# Altium integrated library RL2.IntLib: 663 symbols (part 1 of 4)
Pins are listed as number, name and electrical type; pins without a type are passive.

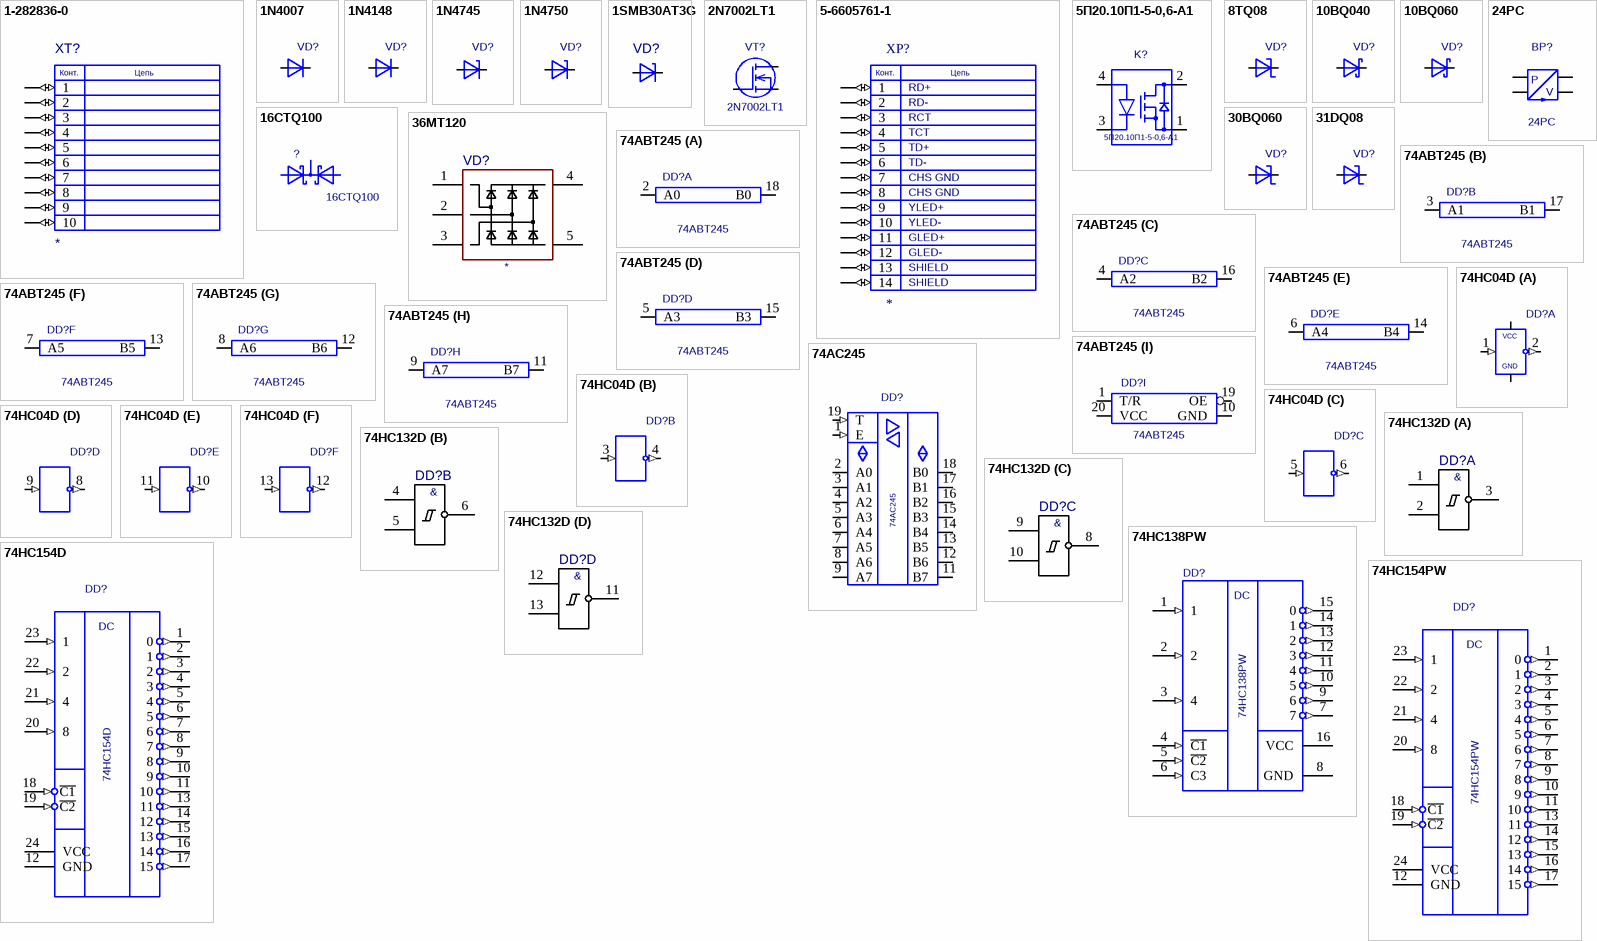
[diagram p0: symbols 1-282836-0 to 74HC154PW]

## 1-282836-0
designator XT?
footprint 1-282836-0
pins: 1 (io), 2 (io), 3 (io), 4 (io), 5 (io), 6 (io), 7 (io), 8 (io), 9 (io), 10 (io)
text: Конт.; Цепь

## 1N4007
designator VD?  (value not drawn)
1N4007; Value: *; Part Field 1: *
footprint DO-41
pins: 1, 2

## 1N4148
designator VD?  (value not drawn)
1N4148; Value: *
footprint DO-41
pins: 1, 2

## 1N4745
designator VD?  (value not drawn)
Docum: аА0.336.162ТУ-85; Value: *
footprint DO-41
pins: 1, 2

## 1N4750
designator VD?  (value not drawn)
Docum: аА0.336.162ТУ-85; Value: *
footprint DO-41
pins: 1, 2

## 1SMB30AT3G
designator VD?  (value not drawn)
footprint DO-214AA
pins: 1, 2

## 2N7002LT1
designator VT?
NPN General Purpose Amplifier; OriginalName: 2N4124; ComponentField6: Published 8-Jun-2000, Modified 11-July-2000: SIM Model Added.; Value: *
simulation model 2N4124
footprint SOT-23
pins: 1 G, 2 S, 3 D

## 5-6605761-1
designator XP?
footprint RJ-45_726ET_CIRCUIT
pins: 1 (io), 2 (io), 3 (io), 4 (io), 5 (io), 6 (io), 7 (io), 8 (io), 9 (io), 10 (io), 11 (io), 12 (io), 13 (io), 14 (io)
text: Конт.; Цепь; RD+; RD-; RCT; TCT; TD+; TD-; CHS GND; YLED+; YLED-; GLED+; GLED-; SHIELD

## 5П20.10П1-5-0,6-А1
designator K?
Value: *
footprint 5П20. -А1
pins: 1 E0, 2 C0, 3 E0, 4 C0

## 8TQ08
designator VD?  (value not drawn)
8TQ08; Value: *
footprint TO-220AC_Primary
footprint TO-220AC_TO-220AC-1
footprint TO-220AC_TO-220AC-R
footprint TO-220AC_TO-220AC-R1
pins: 1 A, 2 K

## 10BQ040
designator VD?  (value not drawn)
10BQ040; Value: *
footprint SMB
pins: 1, 2

## 10BQ060
designator VD?  (value not drawn)
10BQ060; Value: *
footprint DO-214AA SMB
pins: 1, 2

## 16CTQ100
designator ?
Value: *
footprint TO-220AB_Primary
footprint TO-220AB_TO-200AB-R
footprint TO-220AB_TO-200AB-R1
footprint TO-220AB_TO-220AB-1
footprint TO-220AB_TO-220AB-2
pins: 1 A, 2 A, 3 K

## 24PC
designator BP?
Value: *
footprint 24PC
pins: 1, 2, 3, 4
text: P; V

## 30BQ060
designator VD?  (value not drawn)
30BQ060; Value: *
footprint DO-214AB SMC
pins: 1 A, 2 K

## 31DQ08
designator VD?  (value not drawn)
31DQ08; Value: *
footprint D700_AXIAL
pins: 1, 2

## 36MT120
designator VD?
footprint D-63
pins: 1, 2, 3, 4, 5

## 74ABT245
designator DD?
Value: *
footprint SOP20 M20D
part A pins: 2 A0, 18 B0
part B pins: 3 A1, 17 B1
part C pins: 4 A2, 16 B2
part D pins: 5 A3, 15 B3
part E pins: 6 A4, 14 B4
part F pins: 7 A5, 13 B5
part G pins: 8 A6, 12 B6
part H pins: 9 A7, 11 B7
part I pins: 1 T/R, 10 GND, 19 OE, 20 VCC

## 74AC245
designator DD?
Value: *
footprint SO20
pins: 1 E (in), 2 A0 (io), 3 A1 (io), 4 A2 (io), 5 A3 (io), 6 A4 (io), 7 A5 (io), 8 A6 (io), 9 A7 (io), 10 GND (power) hidden to GND, 11 B7 (io), 12 B6 (io), 13 B5 (io), 14 B4 (io), 15 B3 (io), 16 B2 (io), 17 B1 (io), 18 B0 (io), 19 T (in), 20 VCC (power) hidden to VCC

## 74HC04D
designator DD?  (value not drawn)
74HC04D; Value: *
footprint SOIC 14
part A pins: 1 (in), 2 (out), 7 (power), 14 (power)
part B pins: 3 (in), 4 (out)
part C pins: 5 (in), 6 (out)
part D pins: 8 (out), 9 (in)
part E pins: 10 (out), 11 (in)
part F pins: 12 (out), 13 (in)
part A text: VCC; GND

## 74HC132D
designator DD?  (value not drawn)
footprint SOIC 14
pins on every part: 7 GND (power) hidden to GND, 14 VCC (power) hidden to VCC
part A pins: 1, 2, 3
part B pins: 4, 5, 6
part C pins: 8, 9, 10
part D pins: 11, 12, 13
part A text: &
part B text: &
part C text: &
part D text: &

## 74HC138PW
designator DD?
Value: *
footprint TSSOP16 (JEDEC MO-153)
signal-integrity model Model Name (Model Description)
pins: 1 (in), 2 (in), 3 4 (in), 4 ~{C1} (in), 5 ~{C2} (in), 6 C3 (in), 7 (out), 8 GND (power), 9 6 (out), 10 5 (out), 11 4 (out), 12 3 (out), 13 2 (out), 14 1 (out), 15 0 (out), 16 VCC (power)
text: DC

## 74HC154D
designator DD?
Value: *
footprint SO24
pins: 1 0 (out), 2 1 (out), 3 2 (out), 4 3 (out), 5 4 (out), 6 5 (out), 7 6 (out), 8 7 (out), 9 8 (out), 10 9 (out), 11 10 (out), 12 GND (power), 13 11 (out), 14 12 (out), 15 13 (out), 16 14 (out), 17 15 (out), 18 ~{C1} (in), 19 ~{C2} (in), 20 8 (in), 21 4 (in), 22 2 (in), 23 1 (in), 24 VCC (power)
text: DC

## 74HC154PW
designator DD?
Value: *
footprint TSSOP24 (JEDEC MO-153)
pins: 1 0 (out), 2 1 (out), 3 2 (out), 4 3 (out), 5 4 (out), 6 5 (out), 7 6 (out), 8 7 (out), 9 8 (out), 10 9 (out), 11 10 (out), 12 GND (power), 13 11 (out), 14 12 (out), 15 13 (out), 16 14 (out), 17 15 (out), 18 ~{C1} (in), 19 ~{C2} (in), 20 8 (in), 21 4 (in), 22 2 (in), 23 1 (in), 24 VCC (power)
text: DC

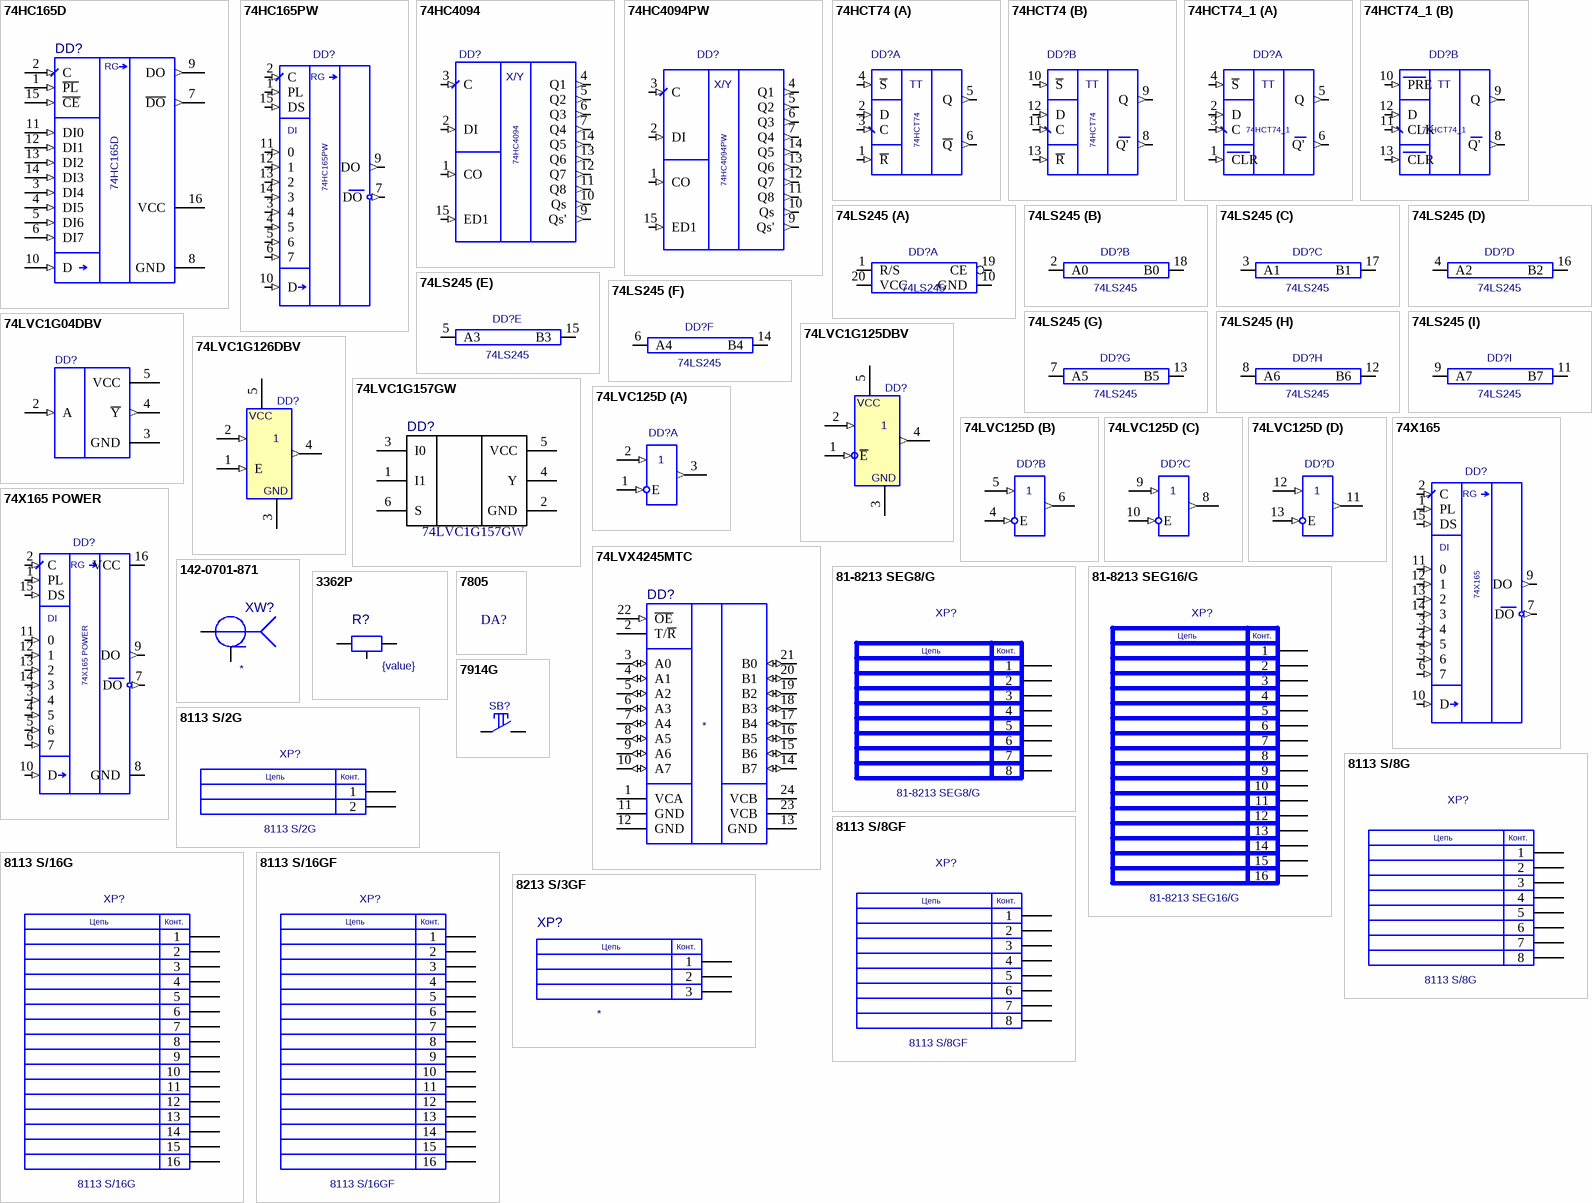
[diagram p1: symbols 74HC165D to 8213 S/3GF]

## 74HC165D
designator DD?
Value: *
footprint SOIC16
pins: 1 ~{PL} (in), 2 C (in), 3 DI4 (in), 4 DI5 (in), 5 DI6 (in), 6 DI7 (in), 7 ~{DO} (out), 8 GND (power), 9 DO (out), 10 D (in), 11 DI0 (in), 12 DI1 (in), 13 DI2 (in), 14 DI3 (in), 15 ~{CE} (in), 16 VCC (power)
text: RG

## 74HC165PW
designator DD?
Value: *
footprint TSSOP16 (JEDEC MO-153)
pins: 1 PL (in), 2 C (in), 3 4 (in), 4 5 (in), 5 6 (in), 6 7 (in), 7 DO (out), 8 GND (power) hidden, 9 DO (out), 10 D (in), 11 0 (in), 12 1 (in), 13 2 (in), 14 3 (in), 15 DS (in), 16 VCC (power) hidden
text: RG; DI

## 74HC4094
designator DD?
Value: *
footprint SOIC16
pins: 1 CO (in), 2 DI (in), 3 C (in), 4 Q1 (out), 5 Q2 (out), 6 Q3 (out), 7 Q4 (out), 8 GND (power) hidden, 9 Qs' (out), 10 Qs (out), 11 Q8 (out), 12 Q7 (out), 13 Q6 (out), 14 Q5 (out), 15 ED1 (in), 16 VCC (power) hidden
text: X/Y

## 74HC4094PW
designator DD?
Value: *
footprint TSSOP16 (JEDEC MO-153)
pins: 1 CO (in), 2 DI (in), 3 C (in), 4 Q1 (out), 5 Q2 (out), 6 Q3 (out), 7 Q4 (out), 8 GND (power) hidden, 9 Qs' (out), 10 Qs (out), 11 Q8 (out), 12 Q7 (out), 13 Q6 (out), 14 Q5 (out), 15 ED1 (in), 16 VCC (power) hidden
text: X/Y

## 74HCT74
designator DD?
Value: *
footprint SOIC 14
pins on every part: 7 GND (power) hidden to GND, 14 VCC (power) hidden to VCC
part A pins: 1 ~{R} (in), 2 D (in), 3 C (in), 4 ~{S} (in), 5 Q (out), 6 ~{Q} (out)
part B pins: 8 Q' (out), 9 Q (out), 10 ~{S} (in), 11 C (in), 12 D (in), 13 ~{R} (in)
part A text: TT
part B text: TT

## 74HCT74_1
designator DD?
Value: *
footprint SOT108-1
pins on every part: 7 GND (power) hidden, 14 VCC (power) hidden
part A pins: 1 CLR (in), 2 D (in), 3 C (in), 4 ~{S} (in), 5 Q (out), 6 Q' (out)
part B pins: 8 Q' (out), 9 Q (out), 10 PRE (in), 11 CLK (in), 12 D (in), 13 CLR (in)
part A text: TT
part B text: TT

## 74LS245
designator DD?
Value: *
footprint DIP20_Primary
footprint DIP20_SO-G20/G7.1
part A pins: 1 R/S, 10 GND (power), 19 CE, 20 VCC (power)
part B pins: 2 A0, 18 B0
part C pins: 3 A1, 17 B1
part D pins: 4 A2, 16 B2
part E pins: 5 A3, 15 B3
part F pins: 6 A4, 14 B4
part G pins: 7 A5, 13 B5
part H pins: 8 A6, 12 B6
part I pins: 9 A7, 11 B7

## 74LVC1G04DBV
designator DD?  (value not drawn)
74LVC1G04DBV; Value: *
footprint SOT23-5
pins: 2 A (in), 3 GND (power), 4 ~{Y} (out), 5 VCC (power)

## 74LVC1G125DBV
designator DD?  (value not drawn)
74LVC1G125DBV; Value: *
footprint SOT23-5
pins: 1 ~{E} (in), 2 (in), 3 GND (power), 4 (out), 5 VCC (power)
1 alternate drawing of the same symbol

## 74LVC1G126DBV
designator DD?  (value not drawn)
74LVC1G126DBV; Value: *
footprint SOT23-5
pins: 1 E (in), 2 (in), 3 GND (power), 4 (out), 5 VCC (power)

## 74LVC1G157GW
designator DD?
footprint SOT-363 (SC-88)
pins: 1 I1, 2 GND, 3 I0, 4 Y, 5 VCC, 6 S

## 74LVC125D
designator DD?  (value not drawn)
74LVC125D; Value: *
footprint SOIC 14
pins on every part: 7 GND (power) hidden, 14 VCC (power) hidden
part A pins: 1 E (in), 2 (in), 3 (out)
part B pins: 4 E (in), 5 (in), 6 (out)
part C pins: 8 (out), 9 (in), 10 E (in)
part D pins: 11 (out), 12 (in), 13 E (in)

## 74LVX4245MTC
designator DD?
74LVX4245MTC; Value: *
footprint TSSOP24 (JEDEC MO-153)
pins: 1 VCA, 2 T/~{R}, 3 A0 (io), 4 A1 (io), 5 A2 (io), 6 A3 (io), 7 A4 (io), 8 A5 (io), 9 A6 (io), 10 A7 (io), 11 GND (power), 12 GND (power), 13 GND (power), 14 B7 (io), 15 B6 (io), 16 B5 (io), 17 B4 (io), 18 B3 (io), 19 B2 (io), 20 B1 (io), 21 B0 (io), 22 ~{OE} (in), 23 VCB (power), 24 VCB (power)

## 74X165
designator DD?
Value: *
footprint SOIC16
pins: 1 PL (in), 2 C (in), 3 4 (in), 4 5 (in), 5 6 (in), 6 7 (in), 7 DO (out), 8 GND (power) hidden, 9 DO (out), 10 D (in), 11 0 (in), 12 1 (in), 13 2 (in), 14 3 (in), 15 DS (in), 16 VCC (power) hidden
text: RG; DI

## 74X165 POWER
designator DD?
Value: *
footprint SOIC16
pins: 1 PL (in), 2 C (in), 3 4 (in), 4 5 (in), 5 6 (in), 6 7 (in), 7 DO (out), 8 GND, 9 DO (out), 10 D (in), 11 0 (in), 12 1 (in), 13 2 (in), 14 3 (in), 15 DS (in), 16 VCC
text: RG; DI

## 81-8213 SEG8/G
designator XP?
Value: *
footprint 81-8213 SEG8/G
pins: 1, 2, 3, 4, 5, 6, 7, 8
text: Цепь; Конт.

## 81-8213 SEG16/G
designator XP?
Value: *
footprint 81-8213 SEG16/G
pins: 1, 2, 3, 4, 5, 6, 7, 8, 9, 10, 11, 12, 13, 14, 15, 16
text: Цепь; Конт.

## 142-0701-871
designator XW?
footprint 142-0701-871
pins: 1, 2

## 3362P
designator R?  value {value}  (hidden comment: *)
footprint 3362P
pins: 1, 2, 3

## 7805
designator DA?  (value not drawn)
7805; Value: *
footprint TO-220AB_Primary
footprint TO-220AB_TO-200AB-R
footprint TO-220AB_TO-200AB-R1
footprint TO-220AB_TO-220AB-1
footprint TO-220AB_TO-220AB-2

## 7914G
designator SB?  (value not drawn)
7914G; Value: *
footprint 7914G
pins: 1, 2, 3 hidden, 4 hidden

## 8113 S/2G
designator XP?
Value: *
footprint 8113S\2G
pins: 1, 2
text: Цепь; Конт.

## 8113 S/8G
designator XP?
Value: *
footprint 8113 S/8G
pins: 1, 2, 3, 4, 5, 6, 7, 8
text: Цепь; Конт.

## 8113 S/8GF
designator XP?
Value: *
footprint 8113 S/8GF
pins: 1, 2, 3, 4, 5, 6, 7, 8
text: Цепь; Конт.

## 8113 S/16G
designator XP?
Value: *
footprint 8113 S/16G
pins: 1, 2, 3, 4, 5, 6, 7, 8, 9, 10, 11, 12, 13, 14, 15, 16
text: Цепь; Конт.

## 8113 S/16GF
designator XP?
Value: *
footprint 8113 S/16GF
pins: 1, 2, 3, 4, 5, 6, 7, 8, 9, 10, 11, 12, 13, 14, 15, 16
text: Цепь; Конт.

## 8213 S/3GF
designator XP?
footprint 8213 S/3GF
pins: 1, 2, 3
text: Цепь; Конт.

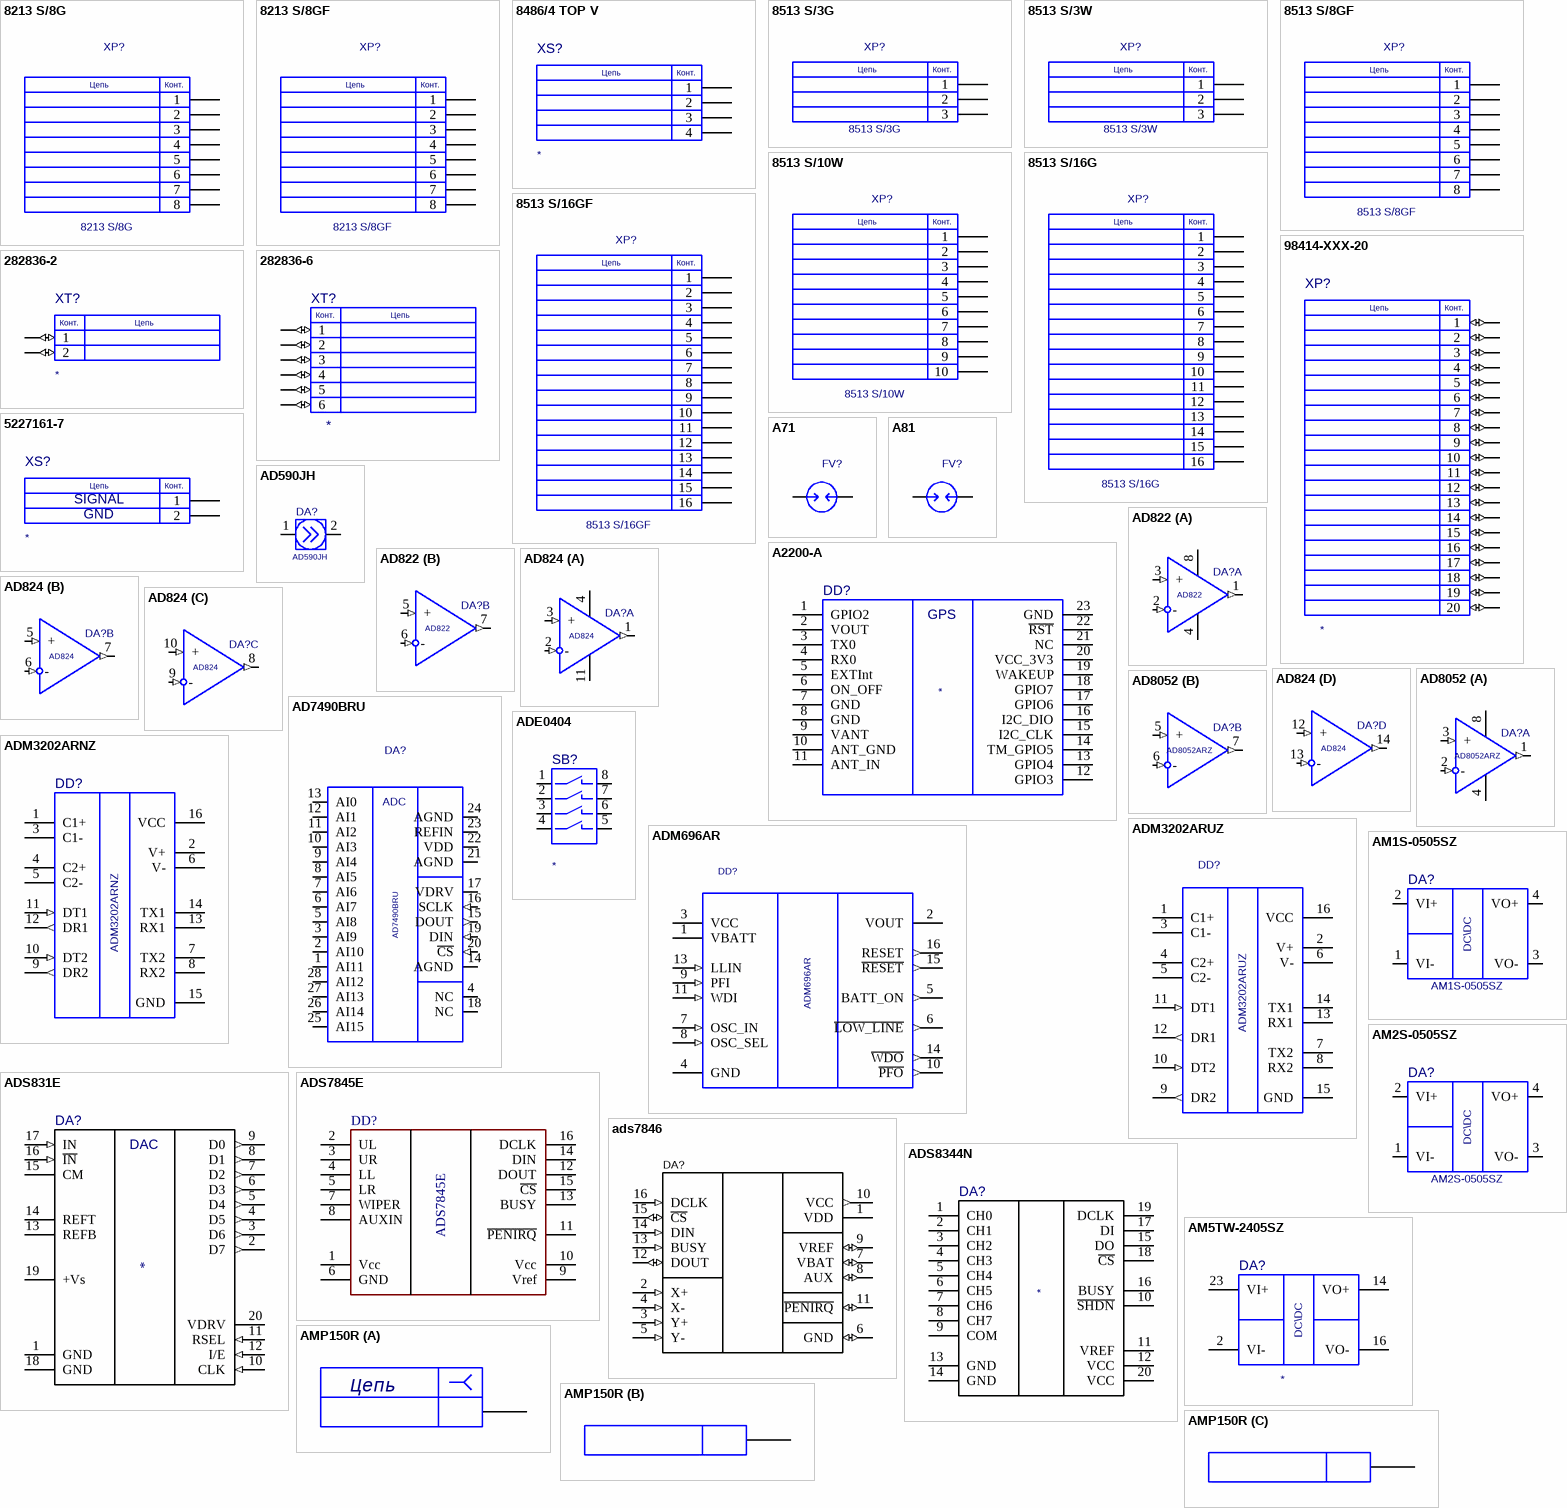
[diagram p2: symbols 8213 S/8G to AMP150R]

## 8213 S/8G
designator XP?
Value: *
footprint 8213 S/8G
pins: 1, 2, 3, 4, 5, 6, 7, 8
text: Цепь; Конт.

## 8213 S/8GF
designator XP?
Value: *
footprint 8213 S/8GF
pins: 1, 2, 3, 4, 5, 6, 7, 8
text: Цепь; Конт.

## 8486/4 TOP V
designator XS?
footprint 8486/4 TOP V (27.703.0453.0)
pins: 1, 2, 3, 4
text: Цепь; Конт.

## 8513 S/3G
designator XP?
Value: *
footprint 8513 S/3G
pins: 1, 2, 3
text: Цепь; Конт.

## 8513 S/3W
designator XP?
Value: *
footprint 8513 S/3W
pins: 1, 2, 3
text: Цепь; Конт.

## 8513 S/8GF
designator XP?
Value: *
footprint 8513 S/8GF
pins: 1, 2, 3, 4, 5, 6, 7, 8
text: Цепь; Конт.

## 8513 S/10W
designator XP?
Value: *
footprint 8513 S/10W
pins: 1, 2, 3, 4, 5, 6, 7, 8, 9, 10
text: Цепь; Конт.

## 8513 S/16G
designator XP?
Value: *
footprint 8513 S/16G
pins: 1, 2, 3, 4, 5, 6, 7, 8, 9, 10, 11, 12, 13, 14, 15, 16
text: Цепь; Конт.

## 8513 S/16GF
designator XP?
Value: *
footprint 8513 S/16GF
pins: 1, 2, 3, 4, 5, 6, 7, 8, 9, 10, 11, 12, 13, 14, 15, 16
text: Цепь; Конт.

## 98414-XXX-20
designator XP?
footprint 98414-XXX-20
pins: 1 (io), 2 (io), 3 (io), 4 (io), 5 (io), 6 (io), 7 (io), 8 (io), 9 (io), 10 (io), 11 (io), 12 (io), 13 (io), 14 (io), 15 (io), 16 (io), 17 (io), 18 (io), 19 (io), 20 (io)
text: Цепь; Конт.

## 282836-2
designator XT?
footprint 282836-2
pins: 1 (io), 2 (io)
text: Конт.; Цепь

## 282836-6
designator XT?
footprint 282836-6
pins: 1 (io), 2 (io), 3 (io), 4 (io), 5 (io), 6 (io)
text: Конт.; Цепь

## 5227161-7
designator XS?
BNC JACK, RIGHT ANGLE, 50 OHM, PCB
footprint BNC 5227161
pins: 1, 2
text: Цепь; Конт.; SIGNAL; GND

## A71
designator FV?  (value not drawn)
Value: {Value}
footprint A71_+1
footprint A71_+2
footprint A71_+3
footprint A71_+4
footprint A71_+5
footprint A71_Primary
footprint A71_v
pins: 1, 2

## A81
designator FV?  (value not drawn)
Value: {Value}
footprint A81
pins: 1, 2

## A2200-A
designator DD?
footprint A2200-A
pins: 1 GPIO2, 2 VOUT, 3 TX0, 4 RX0, 5 EXTInt, 6 ON_OFF, 7 GND, 8 GND, 9 VANT, 10 ANT_GND, 11 ANT_IN, 12 GPIO3, 13 GPIO4, 14 TM_GPIO5, 15 I2C_CLK, 16 I2C_DIO, 17 GPIO6, 18 GPIO7, 19 WAKEUP, 20 VCC_3V3, 21 NC, 22 ~{RST}, 23 GND
text: GPS

## AD590JH
designator DA?
Value: *
footprint TO-52
pins: 1 +, 2 -

## AD822
designator DA?
Value: *
footprint SOIC8 JEDEC
footprint MSOP8
part A pins: 1 OUT (out), 2 - (in), 3 + (in), 4 V- (power), 8 V+ (power)
part B pins: 5 + (in), 6 - (in), 7 OUT (out)

## AD824
designator DA?
Value: *
footprint SOIC 14
part A pins: 1 OUT (out), 2 - (in), 3 + (in), 4 V+ (power), 11 V- (power)
part B pins: 5 + (in), 6 - (in), 7 OUT (out)
part C pins: 8 OUT (out), 9 - (in), 10 + (in)
part D pins: 12 + (in), 13 - (in), 14 OUT (out)

## AD7490BRU
designator DA?
Value: *
footprint TSSOP28 (JEDEC MO-153)
pins: 1 AI11, 2 AI10, 3 AI9, 4 NC, 5 AI8, 6 AI7, 7 AI6, 8 AI5, 9 AI4, 10 AI3, 11 AI2, 12 AI1, 13 AI0, 14 AGND (power), 15 DOUT (out), 16 SCLK (in), 17 VDRV (power), 18 NC, 19 DIN (in), 20 ~{CS} (in), 21 AGND (power), 22 VDD (power), 23 REFIN (power), 24 AGND (power), 25 AI15, 26 AI14, 27 AI13, 28 AI12
text: ADC

## AD8052
designator DA?, comment AD8052ARZ
Value: *
footprint SOIC8 JEDEC
footprint MSOP8
part A pins: 1 OUT (out), 2 - (in), 3 + (in), 4 V- (power), 8 V+ (power)
part B pins: 5 + (in), 6 - (in), 7 OUT (out)

## ADE0404
designator SB?
footprint DIP_SWITCH4
pins: 1 S3_1, 2 S3_2, 3 S1_1, 4 S2_1, 5 S4_1, 6 S4_2, 7 S2_2, 8 S1_2

## ADM696AR
designator DD?
Value: *
footprint SO16
pins: 1 VBATT (power), 2 VOUT (power), 3 VCC (power), 4 GND (power), 5 BATT_ON (out), 6 ~{LOW_LINE} (out), 7 OSC_IN (in), 8 OSC_SEL (in), 9 PFI (in), 10 ~{PFO} (out), 11 WDI (in), 12 hidden, 13 LLIN (in), 14 ~{WDO} (out), 15 ~{RESET} (out), 16 RESET (out)

## ADM3202ARNZ
designator DD?
Value: *
footprint SOIC16
pins: 1 C1+, 2 V+, 3 C1-, 4 C2+, 5 C2-, 6 V-, 7 TX2, 8 RX2, 9 DR2 (out), 10 DT2 (in), 11 DT1 (in), 12 DR1 (out), 13 RX1, 14 TX1, 15 GND (power), 16 VCC (power)

## ADM3202ARUZ
designator DD?
Value: *
footprint TSSOP16 (JEDEC MO-153)
pins: 1 C1+, 2 V+, 3 C1-, 4 C2+, 5 C2-, 6 V-, 7 TX2, 8 RX2, 9 DR2 (out), 10 DT2 (in), 11 DT1 (in), 12 DR1 (out), 13 RX1, 14 TX1, 15 GND (power), 16 VCC (power)

## ADS831E
designator DA?
footprint DBQ-20
signal-integrity model Model Name (Model Description)
pins: 1 GND (power), 2 D7 (out), 3 D6 (out), 4 D5 (out), 5 D4 (out), 6 D3 (out), 7 D2 (out), 8 D1 (out), 9 D0 (out), 10 CLK (in), 11 RSEL (in), 12 I/E (in), 13 REFB (power), 14 REFT (power), 15 CM (power), 16 ~{IN} (in), 17 IN (in), 18 GND (power), 19 +Vs (power), 20 VDRV (power)
text: DAC

## ADS7845E
designator DD?
footprint SSOP16 (JEDEC MO-137)
pins: 1 Vcc, 2 UL, 3 UR, 4 LL, 5 LR, 6 GND, 7 WIPER, 8 AUXIN, 9 Vref, 10 Vcc, 11 ~{PENIRQ}, 12 DOUT, 13 BUSY, 14 DIN, 15 ~{CS}, 16 DCLK

## ads7846
designator DA?  (value not drawn)
footprint TSSOP16 (JEDEC MO-153)
pins: 1 VDD (power), 2 X+ (in), 3 Y+ (in), 4 X- (in), 5 Y- (in), 6 GND (io), 7 VBAT (io), 8 AUX (io), 9 VREF (io), 10 VCC (out), 11 ~{PENIRQ} (io), 12 DOUT (io), 13 BUSY (in), 14 DIN (in), 15 ~{CS} (io), 16 DCLK (in)

## ADS8344N
designator DA?
footprint SSOP-20 (MO-150)
pins: 1 CH0, 2 CH1, 3 CH2, 4 CH3, 5 CH4, 6 CH5, 7 CH6, 8 CH7, 9 COM, 10 ~{SHDN}, 11 VREF, 12 VCC, 13 GND, 14 GND, 15 DO, 16 BUSY, 17 DI, 18 ~{CS}, 19 DCLK, 20 VCC

## AM1S-0505SZ
designator DA?
Value: *
footprint DC-DC SIP4
pins: 1 VI-, 2 VI+, 3 VO- (power), 4 VO+ (power)
text: DC\DC

## AM2S-0505SZ
designator DA?
Value: *
footprint DC-DC SIP4 2W
pins: 1 VI-, 2 VI+, 3 VO- (power), 4 VO+ (power)
text: DC\DC

## AM5TW-2405SZ
designator DA?
AM5TW-2405SZ; Value: *
footprint DC-DC DIP24_AM5TW-2405SZ(Primary)
pins: 2 VI-, 14 VO+, 16 VO-, 23 VI+
text: DC\DC

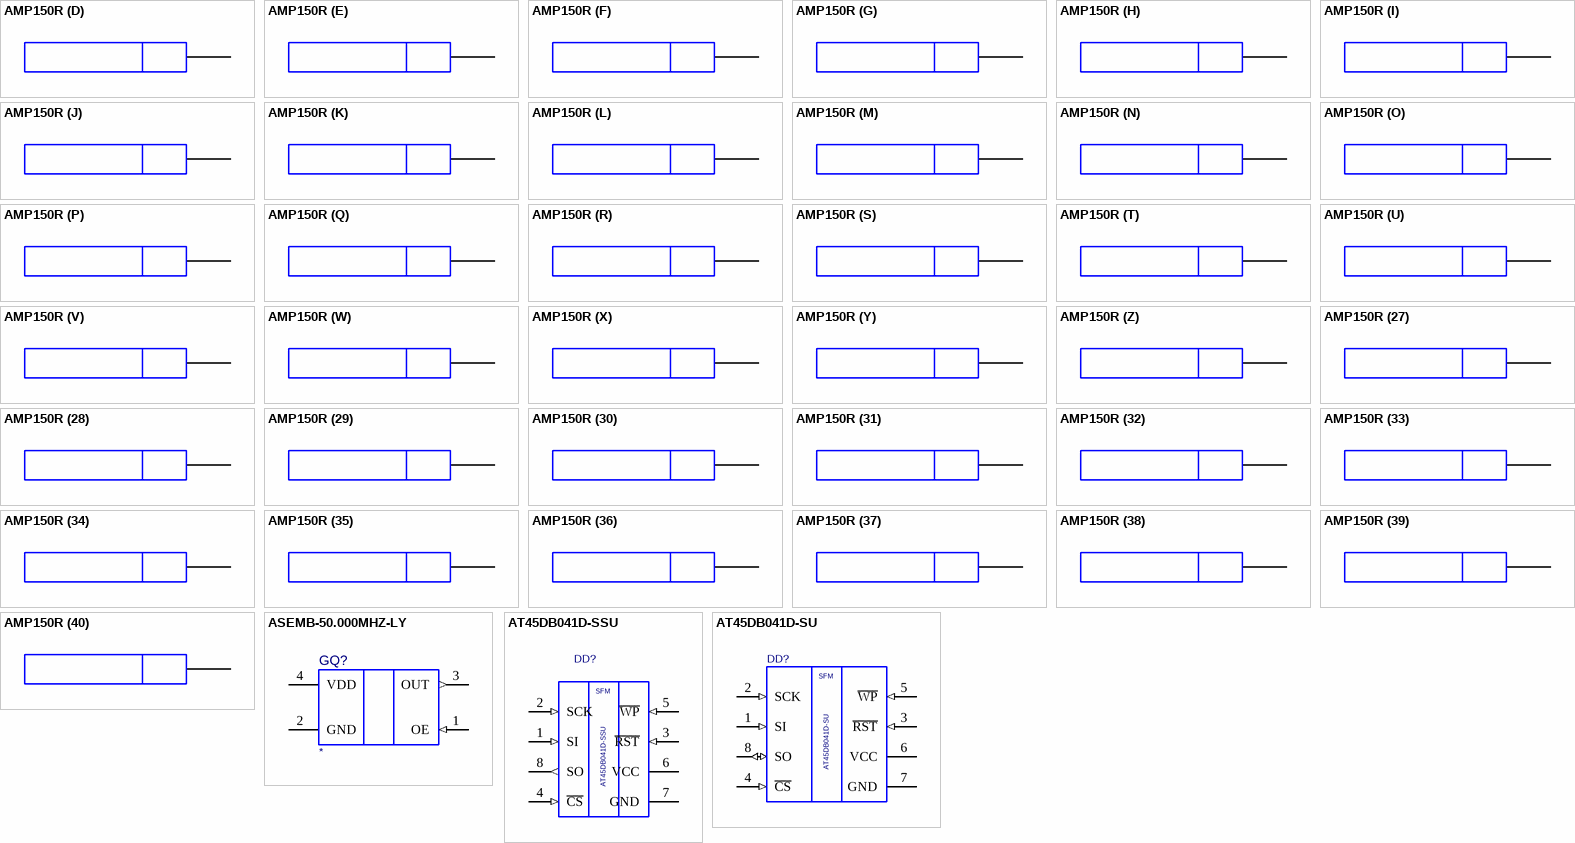
[diagram p3: symbols AMP150R to AT45DB041D-SU]

## AMP150R
designator X?  (value not drawn)
Author: http://sevastianov.simbir.ru; Value: *
footprint AMP150R
pins on every part: 151 hidden, 152 hidden
part A pins: 1 a1
part B pins: 2 a2
part C pins: 3 a3
part D pins: 4 a4
part E pins: 5 a5
part F pins: 6 a6
part G pins: 7 a7
part H pins: 8 a8
part I pins: 9 a9
part J pins: 10 a10
part K pins: 11 a11
part L pins: 12 a12
part M pins: 13 a13
part N pins: 14 a14
part O pins: 15 a15
part P pins: 16 a16
part Q pins: 17 a17
part R pins: 18 a18
part S pins: 19 a19
part T pins: 20 a20
part U pins: 21 a21
part V pins: 22 a22
part W pins: 23 a23
part X pins: 24 a24
part Y pins: 25 a25
part Z pins: 26 a26
part 27 pins: 27 a27
part 28 pins: 28 a28
part 29 pins: 29 a29
part 30 pins: 30 a30
part 31 pins: 31 a31
part 32 pins: 32 a32
part 33 pins: 33 a33
part 34 pins: 34 a34
part 35 pins: 35 a35
part 36 pins: 36 a36
part 37 pins: 37 a37
part 38 pins: 38 a38
part 39 pins: 39 a39
part 40 pins: 40 a40
part 41 pins: 41 a41
part 42 pins: 42 a42
part 43 pins: 43 a43
part 44 pins: 44 a44
part 45 pins: 45 a45
part 46 pins: 46 a46
part 47 pins: 47 a47
part 48 pins: 48 a48
part 49 pins: 49 a49
part 50 pins: 50 a50
part 51 pins: 51 b1
part 52 pins: 52 b2
part 53 pins: 53 b3
part 54 pins: 54 b4
part 55 pins: 55 b5
part 56 pins: 56 b6
part 57 pins: 57 b7
part 58 pins: 58 b8
part 59 pins: 59 b9
part 60 pins: 60 b10
part 61 pins: 61 b11
part 62 pins: 62 b12
part 63 pins: 63 b13
part 64 pins: 64 b14
part 65 pins: 65 b15
part 66 pins: 66 b16
part 67 pins: 67 b17
part 68 pins: 68 b18
part 69 pins: 69 b19
part 70 pins: 70 b20
part 71 pins: 71 b21
part 72 pins: 72 b22
part 73 pins: 73 b23
part 74 pins: 74 b24
part 75 pins: 75 b25
part 76 pins: 76 b26
part 77 pins: 77 b27
part 78 pins: 78 b28
part 79 pins: 79 b29
part 80 pins: 80 b30
part 81 pins: 81 b31
part 82 pins: 82 b32
part 83 pins: 83 b33
part 84 pins: 84 b34
part 85 pins: 85 b35
part 86 pins: 86 b36
part 87 pins: 87 b37
part 88 pins: 88 b38
part 89 pins: 89 b39
part 90 pins: 90 b40
part 91 pins: 91 b41
part 92 pins: 92 b42
part 93 pins: 93 b43
part 94 pins: 94 b44
part 95 pins: 95 b45
part 96 pins: 96 b46
part 97 pins: 97 b47
part 98 pins: 98 b48
part 99 pins: 99 b49
part 100 pins: 100 b50
part 101 pins: 101 c1
part 102 pins: 102 c2
part 103 pins: 103 c3
part 104 pins: 104 c4
part 105 pins: 105 c5
part 106 pins: 106 c6
part 107 pins: 107 c7
part 108 pins: 108 c8
part 109 pins: 109 c9
part 110 pins: 110 c10
part 111 pins: 111 c11
part 112 pins: 112 c12
part 113 pins: 113 c13
part 114 pins: 114 c14
part 115 pins: 115 c15
part 116 pins: 116 c16
part 117 pins: 117 c17
part 118 pins: 118 c18
part 119 pins: 119 c19
part 120 pins: 120 c20
part 121 pins: 121 c21
part 122 pins: 122 c22
part 123 pins: 123 c23
part 124 pins: 124 c24
part 125 pins: 125 c25
part 126 pins: 126 c26
part 127 pins: 127 c27
part 128 pins: 128 c28
part 129 pins: 129 c29
part 130 pins: 130 c30
part 131 pins: 131 c31
part 132 pins: 132 c32
part 133 pins: 133 c33
part 134 pins: 134 c34
part 135 pins: 135 c35
part 136 pins: 136 c36
part 137 pins: 137 c37
part 138 pins: 138 c38
part 139 pins: 139 c39
part 140 pins: 140 c40
part 141 pins: 141 c41
part 142 pins: 142 c42
part 143 pins: 143 c43
part 144 pins: 144 c44
part 145 pins: 145 c45
part 146 pins: 146 c46
part 147 pins: 147 c47
part 148 pins: 148 c48
part 149 pins: 149 c49
part 150 pins: 150 c50
part A text: Цепь

## ASEMB-50.000MHZ-LY
designator GQ?
footprint QUARTZ-3.2mm-2.5mm
signal-integrity model ASEMB (ASEMB Quartz oscillator)
pins: 1 OE (in), 2 GND (power), 3 OUT (out), 4 VDD (power)

## AT45DB041D-SSU
designator DD?
Value: *
footprint SOIC8 JEDEC
pins: 1 SI (in), 2 SCK (in), 3 ~{RST} (in), 4 ~{CS} (in), 5 ~{WP} (in), 6 VCC (power), 7 GND (power), 8 SO (out)
text: SFM

## AT45DB041D-SU
designator DD?
Value: *
footprint SOIC8 EIAJ
signal-integrity model AT45DB041D_si (Model Description)
pins: 1 SI (in), 2 SCK (in), 3 ~{RST} (in), 4 ~{CS} (in), 5 ~{WP} (in), 6 VCC (power), 7 GND (power), 8 SO (io)
text: SFM

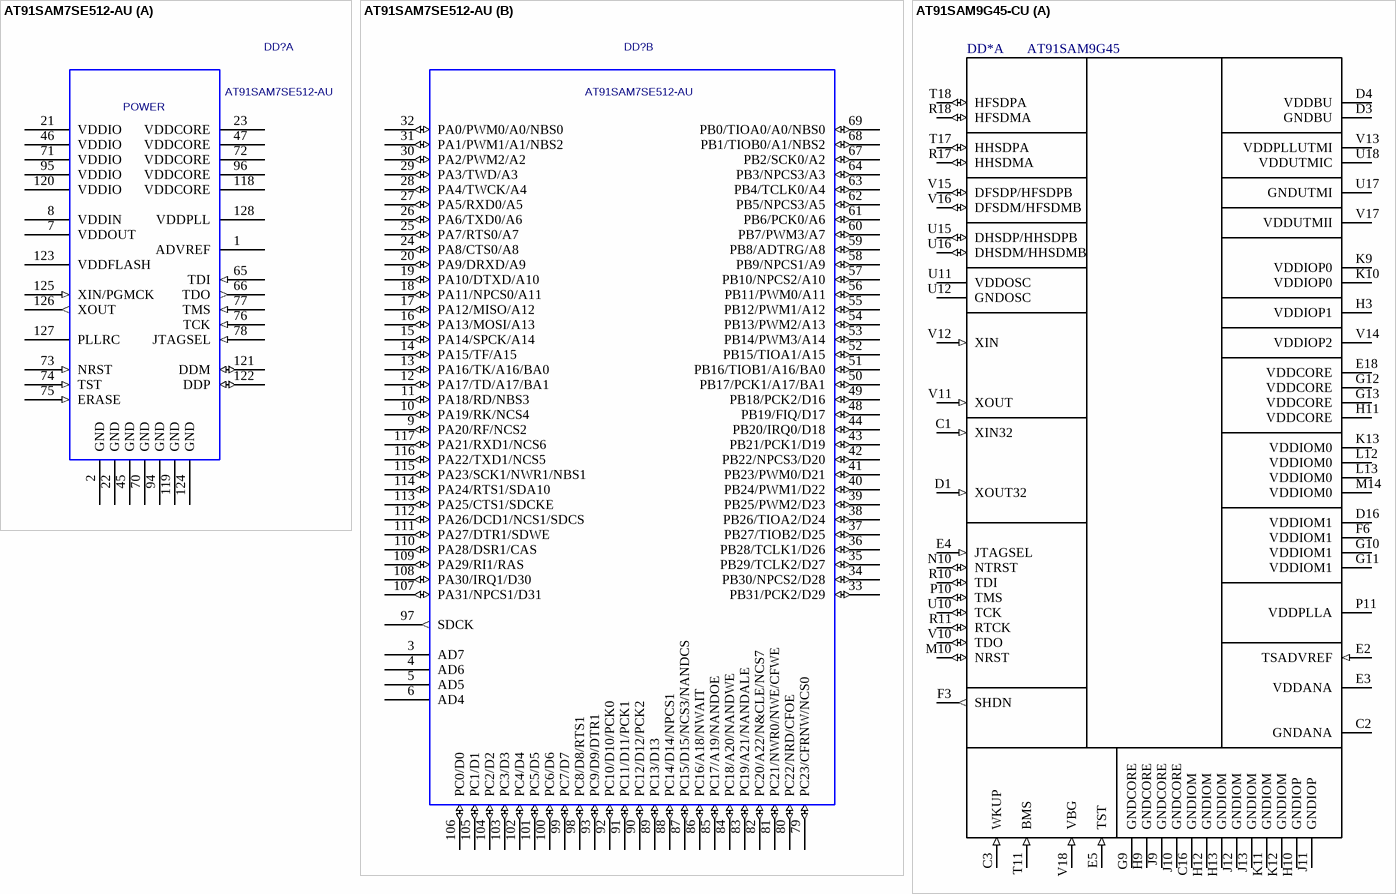
[diagram p4: symbols AT91SAM7SE512-AU to AT91SAM9G45-CU]

## AT91SAM7SE512-AU
designator DD?
Value: *
footprint LQFP128
part A pins: 1 ADVREF (power), 2 GND (power), 7 VDDOUT (power), 8 VDDIN (power), 21 VDDIO (power), 22 GND (power), 23 VDDCORE (power), 45 GND (power), 46 VDDIO (power), 47 VDDCORE (power), 65 TDI (in), 66 TDO (out), 70 GND (power), 71 VDDIO (power), 72 VDDCORE (power), 73 NRST (in), 74 TST (in), 75 ERASE (in), 76 TCK (in), 77 TMS (in), 78 JTAGSEL (in), 94 GND (power), 95 VDDIO (power), 96 VDDCORE (power), 118 VDDCORE (power), 119 GND (power), 120 VDDIO (power), 121 DDM (io), 122 DDP (io), 123 VDDFLASH (power), 124 GND (power), 125 XIN/PGMCK (in), 126 XOUT (out), 127 PLLRC, 128 VDDPLL (power)
part B pins: 3 AD7, 4 AD6, 5 AD5, 6 AD4, 9 PA20/RF/NCS2 (io), 10 PA19/RK/NCS4 (io), 11 PA18/RD/NBS3 (io), 12 PA17/TD/A17/BA1 (io), 13 PA16/TK/A16/BA0 (io), 14 PA15/TF/A15 (io), 15 PA14/SPCK/A14 (io), 16 PA13/MOSI/A13 (io), 17 PA12/MISO/A12 (io), 18 PA11/NPCS0/A11 (io), 19 PA10/DTXD/A10 (io), 20 PA9/DRXD/A9 (io), 24 PA8/CTS0/A8 (io), 25 PA7/RTS0/A7 (io), 26 PA6/TXD0/A6 (io), 27 PA5/RXD0/A5 (io), 28 PA4/TWCK/A4 (io), 29 PA3/TWD/A3 (io), 30 PA2/PWM2/A2 (io), 31 PA1/PWM1/A1/NBS2 (io), 32 PA0/PWM0/A0/NBS0 (io), 33 PB31/PCK2/D29 (io), 34 PB30/NPCS2/D28 (io), 35 PB29/TCLK2/D27 (io), 36 PB28/TCLK1/D26 (io), 37 PB27/TIOB2/D25 (io), 38 PB26/TIOA2/D24 (io), 39 PB25/PWM2/D23 (io), 40 PB24/PWM1/D22 (io), 41 PB23/PWM0/D21 (io), 42 PB22/NPCS3/D20 (io), 43 PB21/PCK1/D19 (io), 44 PB20/IRQ0/D18 (io), 48 PB19/FIQ/D17 (io), 49 PB18/PCK2/D16 (io), 50 PB17/PCK1/A17/BA1 (io), 51 PB16/TIOB1/A16/BA0 (io), 52 PB15/TIOA1/A15 (io), 53 PB14/PWM3/A14 (io), 54 PB13/PWM2/A13 (io), 55 PB12/PWM1/A12 (io), 56 PB11/PWM0/A11 (io), 57 PB10/NPCS2/A10 (io), 58 PB9/NPCS1/A9 (io), 59 PB8/ADTRG/A8 (io), 60 PB7/PWM3/A7 (io), 61 PB6/PCK0/A6 (io), 62 PB5/NPCS3/A5 (io), 63 PB4/TCLK0/A4 (io), 64 PB3/NPCS3/A3 (io), 67 PB2/SCK0/A2 (io), 68 PB1/TIOB0/A1/NBS2 (io), 69 PB0/TIOA0/A0/NBS0 (io), 79 PC23/CFRNW/NCS0 (io), 80 PC22/NRD/CFOE (io), 81 PC21/NWR0/NWE/CFWE (io), 82 PC20/A22/N&CLE/NCS7 (io), 83 PC19/A21/NANDALE (io), 84 PC18/A20/NANDWE (io), 85 PC17/A19/NANDOE (io), 86 PC16/A18/NWAIT (io), 87 PC15/D15/NCS3/NANDCS (io), 88 PC14/D14/NPCS1 (io), 89 PC13/D13 (io), 90 PC12/D12/PCK2 (io), 91 PC11/D11/PCK1 (io), 92 PC10/D10/PCK0 (io), 93 PC9/D9/DTR1 (io), 97 SDCK (out), 98 PC8/D8/RTS1 (io), 99 PC7/D7 (io), 100 PC6/D6 (io), 101 PC5/D5 (io), 102 PC4/D4 (io), 103 PC3/D3 (io), 104 PC2/D2 (io), 105 PC1/D1 (io), 106 PC0/D0 (io), 107 PA31/NPCS1/D31 (io), 108 PA30/IRQ1/D30 (io), 109 PA29/RI1/RAS (io), 110 PA28/DSR1/CAS (io), 111 PA27/DTR1/SDWE (io), 112 PA26/DCD1/NCS1/SDCS (io), 113 PA25/CTS1/SDCKE (io), 114 PA24/RTS1/SDA10 (io), 115 PA23/SCK1/NWR1/NBS1 (io), 116 PA22/TXD1/NCS5 (io), 117 PA21/RXD1/NCS6 (io)
part A text: POWER

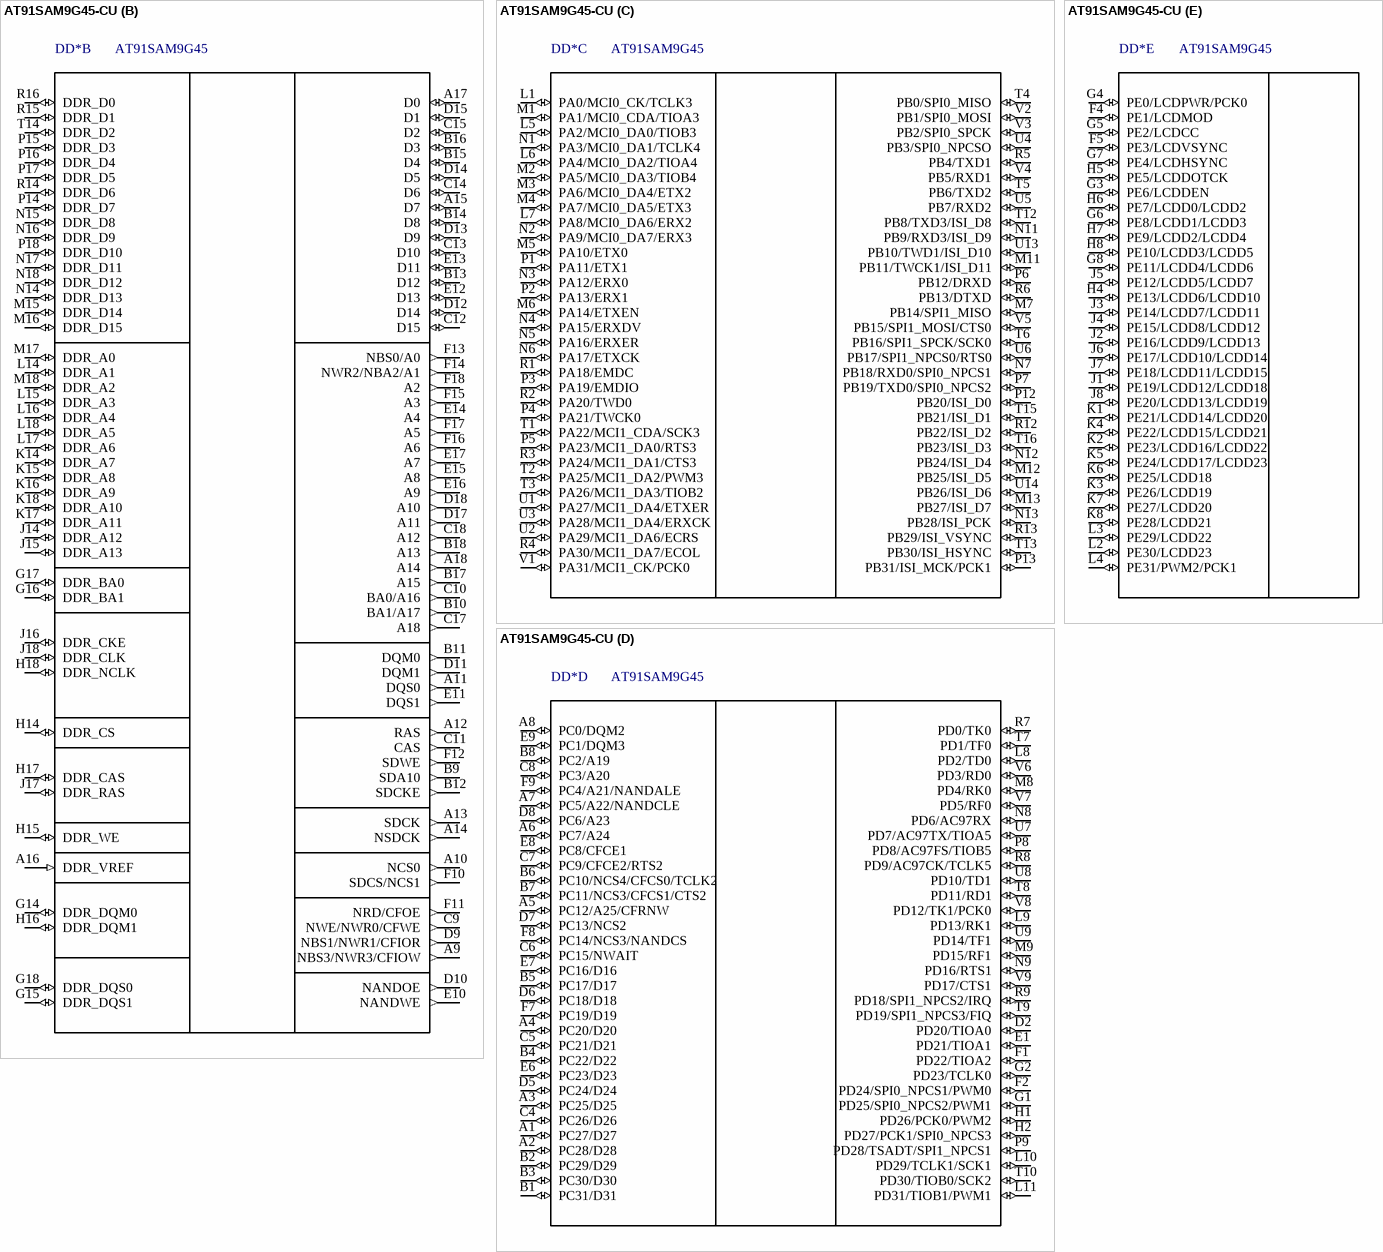
[diagram p5: symbol AT91SAM9G45-CU]
